# Altium footprint library iuh-thuc-hanh.PcbLib: 63 footprints (part 3 of 4)
Each footprint in its own frame and in the unit in brackets; x right, y up, seen from the top. Pads: shape width x height; smd on the part's side, far side on the other; paste and mask are expansions set on the pad; w line width, h text height; cw(c..) or ccw(c..) is an arc to the next point about the centre after c.
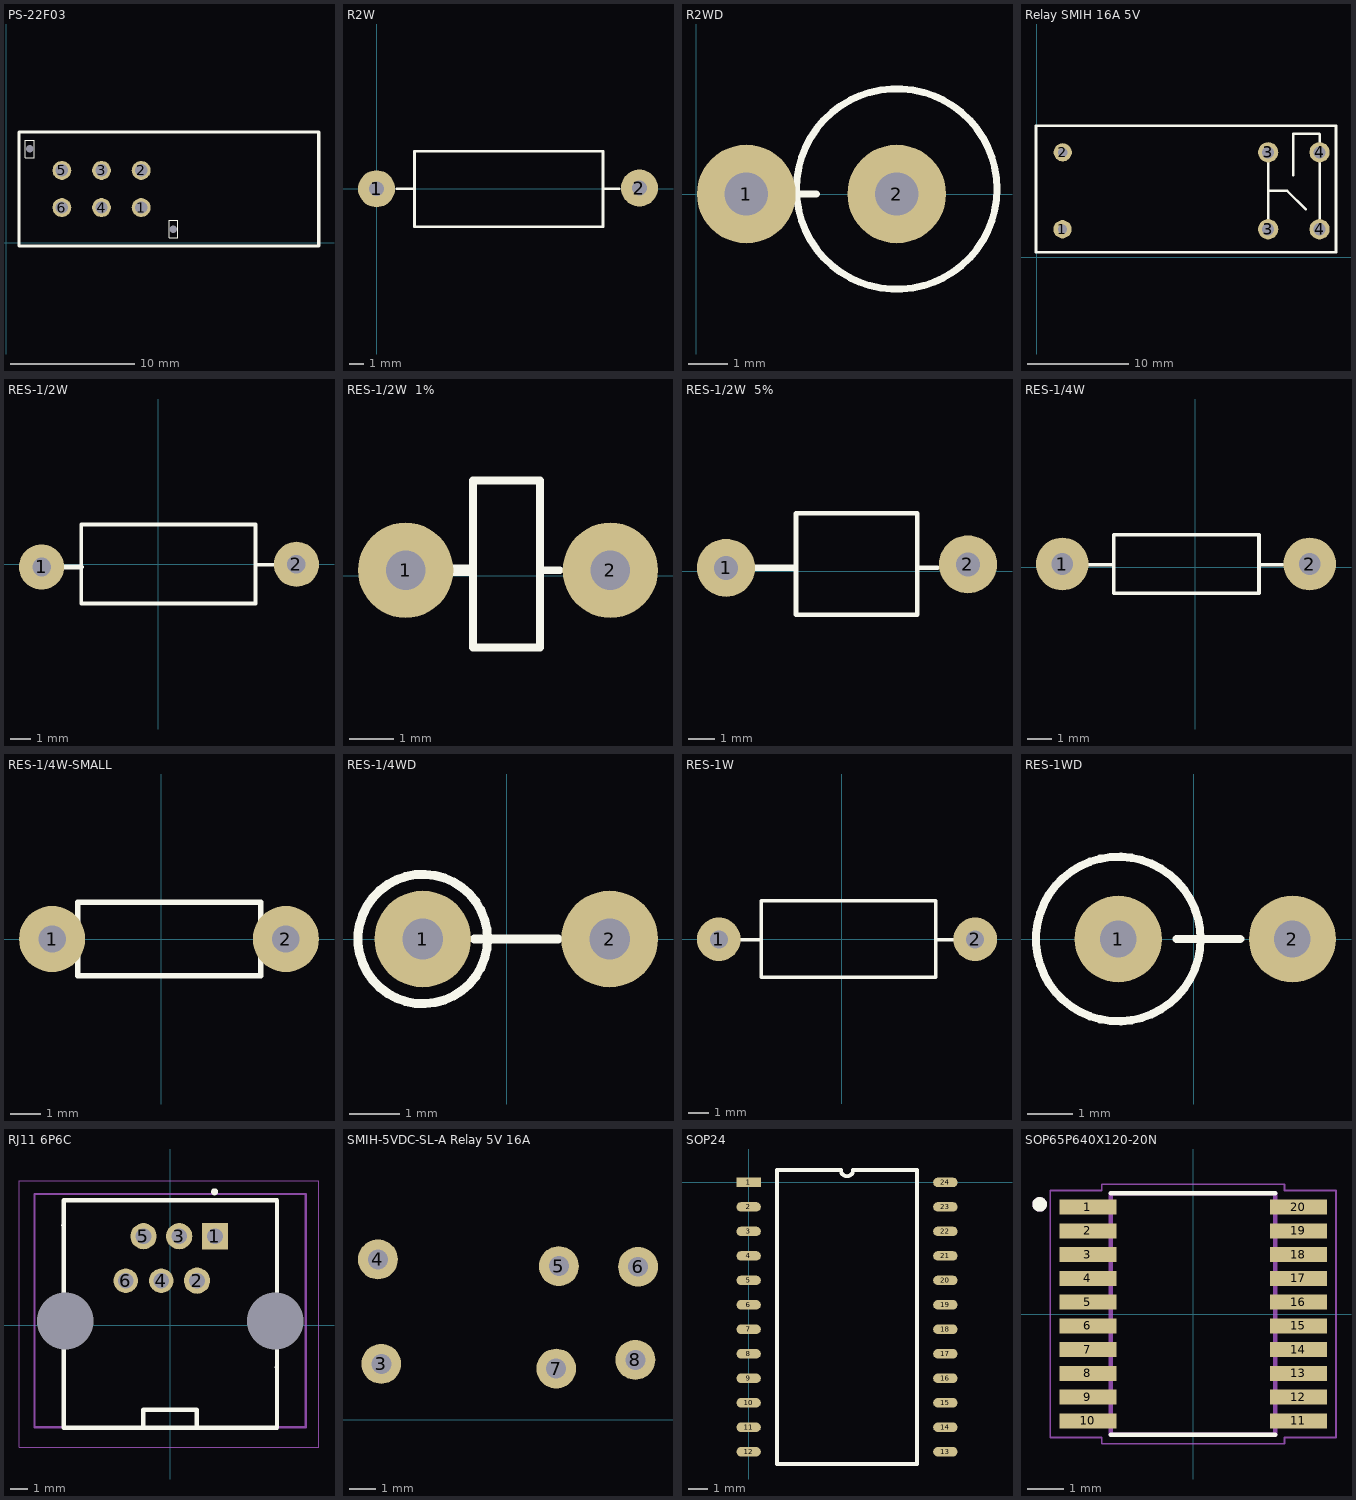
[diagram p2: the footprints below, top view; thin cyan lines are the x and y axes]

## PS-22F03 [mm]
pads (8):
  round 0 hole 0.6 square mask-2539.97: 0(1.88,7.595) 0(13.48,1.095)
  round 1.524 hole 1: 1(10.88,2.845) 2(10.88,5.845) 3(7.68,5.845) 4(7.68,2.845) 5(4.48,5.845) 6(4.48,2.845)
Top Overlay:
  lines w0.1: 1.524,6.883 1.524,8.28 2.235,8.28 2.235,8.077 2.235,6.883 1.524,6.883 ; 13.132,0.406 13.132,1.803 13.843,1.803 13.843,1.6 13.843,0.406 13.132,0.406
  lines w0.254: 25.222,8.941 25.222,-0.254 1.016,-0.254 1.016,8.941 25.246,8.941

## R2W [mm] "R2W, 2 pin, 700mil"
height 5.08
pads (2):
  round 2.5 hole 1: 1(0,0) 2(17.755,0.051)
Top Overlay:
  lines w0.178: 1.372,0 2.565,0 ; 15.316,0 16.383,0 ; 2.565,0 2.565,2.54 15.291,2.54 15.291,-2.565 2.565,-2.565 2.565,0
3D body "SW3dPS-AXIAL_RESISTOR(3W).STEP": height 8.3, standoff -2, extent -2.362,-3.327 19.838,3.273

## R2WD [mm] "R2W, 2 pin, 150mil"
height 5.08
pads (2):
  round 2.5 hole 1.1: 1(1.27,0) 2(5.08,0)
Top Overlay:
  circle w0.178: c5.08,0.127 r2.54
  lines w0.178: 2.159,0 3.048,0
3D body "User Library-User Library-RES-1W_stand_up_6mm.step": height 13.97, standoff -5.5, extent -1.25,-2.413 7.6,2.587

## Relay SMIH 16A 5V [mm]
pads (6):
  round 1.8 hole 0.9: 1(2.54,2.743) 2(2.565,10.343)
  round 2 hole 1.2: 3(22.86,2.743) 3(22.86,10.343) 4(27.94,2.743) 4(27.94,10.343)
Top Overlay:
  lines w0.254: 22.86,2.743 22.86,10.343 ; 22.86,6.543 24.749,6.543 26.594,4.699 ; 25.349,8.077 25.349,12.167 26.035,12.167 27.915,12.167 27.94,12.141 27.94,10.343 27.94,2.743 ; -0.076,0.483 -0.076,12.983 29.566,12.983 29.566,0.457 -0.051,0.457 -0.076,0.483

## RES-1/2W [mil]
height 100
pads (2):
  round 85 hole 35: 1(-220,-5) 2(260,0)
Top Overlay:
  lines w7: 183,-1 221,-1 ; -145,-73.81 -145,75 183,75 183,-73.81 -145,-73.81
  lines w10: -195,-5 -145,-5
3D body "User Library-Metal film resistor0_5W.step": height 121.06, standoff -118.11, extent -230,-60 270,56.14

## RES-1/2W  1% [mil]
height 100
pads (2):
  round 85 hole 35: 1(72.5,5) 2(255.12,5)
Top Overlay:
  lines w7: 192.5,5 210,5 ; 132.5,-63.81 132.5,85 192.5,85 192.5,-63.81 132.5,-63.81
  lines w10: 97.5,5 127.5,5

## RES-1/2W  5% [mil]
height 100
pads (2):
  round 85 hole 35: 1(72.5,5) 2(426.85,10)
Top Overlay:
  lines w7: 353.09,5 365,5 382.5,5 ; 175,-63.81 352.5,-63.81 352.5,85 175,85 175,-63.81
  lines w10: 97.5,5 127.5,5 172.5,5

## RES-1/4W [mil]
height 100
pads (2):
  round 85 hole 35: 1(-215,5) 2(185,5)
Top Overlay:
  lines w5.91: -173,4 -132,4 ; 103,4 141,4 ; -132,-42.24 103,-42.24 103,52.25 -132,52.25 -132,-42.24
3D body "User Library-Res40-Axial Short 0_25W-0_1R.step": height 95, standoff -78.74, extent -226.8,-42.24 196.82,52.25

## RES-1/4W-SMALL [mil]
height 100
pads (2):
  round 85 hole 35: 1(-140,0) 2(160,0)
Top Overlay:
  lines w7: -148,-1 -107,-1 ; 128,-1 166,-1 ; -107,-47.24 -107,47.25 128,47.25 128,-47.24 -107,-47.24
3D body "User Library-R-Axial-0_25W-7_62.step": height 97.4, standoff -146.85, extent -151.8,-47.39 171.82,47.4

## RES-1/4WD [mm]
height 2.54
pads (2):
  round 1.905 hole 0.8: 1(-1.651,0) 2(2.032,0)
Top Overlay:
  circle w0.178: c-1.651,0 r1.276
  lines w0.178: -0.635,0 1.016,0
3D body "User Library-RESAD375W60L650D230_0_25W.STEP": height 9.64, standoff -2.66, extent -2.854,-1.143 2.346,1.157

## RES-1W [mil]
height 100
pads (2):
  round 85 hole 35: 1(-240,0) 2(260,0)
Top Overlay:
  lines w7: -198,-1 -157,-1 ; 183,-1 221,-1 ; -157,-73.81 183,-73.81 183,75 -157,75 -157,-73.81
3D body "User Library-Res50-Axial 0_5W-3_3K.step": height 188.98, standoff -180.12, extent -254.76,-73.81 274.77,73.82

## RES-1WD [mm]
height 2.54
pads (2):
  round 1.905 hole 0.8: 1(-1.651,0) 2(2.159,0)
Top Overlay:
  circle w0.178: c-1.651,0 r1.8
  lines w0.178: -0.381,0 1.016,0
3D body "SW3DPS-0_5W METAL FILM RESISTOR-DEFAULT.STEP": height 12.65, standoff -5.05, extent -3.429,-1.7 2.671,1.7

## RJ11 6P6C [mm]
pads (8):
  rect 1.5x1.5 hole 0.9: 1(2.559,5.08)
  round 1.5 hole 0.9: 2(1.539,2.54) 3(0.519,5.08) 5(-1.521,5.08)
  round 1.4 hole 0.9: 4(-0.501,2.54) 6(-2.541,2.54)
  round 2.3 hole 3.25 unplated: ""(-5.991,0.24) ""(6.009,0.24)
Top Overlay:
  circle w0.2: c2.54,7.62 r0.1
  lines w0.254: -6.096,5.715 -6.091,5.71 ; -1.524,-5.842 -1.524,-4.842 1.524,-4.842 1.524,-5.842 ; 6.096,-2.413 6.109,-2.426 ; -6.091,-5.86 -6.091,7.14 6.109,7.14 6.109,-5.86 -6.091,-5.86
Mechanical 13:
  lines w0.127: -7.747,-5.842 -7.747,7.493 7.747,7.493 7.747,-5.842 -7.747,-5.842
Mechanical 15:
  lines w0.05: -8.636,-6.985 -8.636,8.255 8.509,8.255 8.509,-6.985 -8.636,-6.985
3D body "TJ6P6C gray.stp": height 14.55, standoff -3.2, extent -7.244,-5.695 7.256,7.305

## SMIH-5VDC-SL-A Relay 5V 16A [mil]
pads (6):
  round 60 hole 30: 3(99,84) 4(94,241) 5(366,231) 6(485,230) 7(362,77) 8(481,90)

## SOP24 [mm]
pads (24):
  rect 1.27x0.49 smd: 1(0,0)
  oval 1.27x0.49 smd: 2(0,-1.27) 3(0,-2.54) 4(0,-3.81) 5(0,-5.08) 6(0,-6.35) 7(0,-7.62) 8(0,-8.89) 9(0,-10.16) 10(0,-11.43) 11(0,-12.7) 12(0,-13.97) 13(10.2,-13.97) 14(10.2,-12.7) 15(10.2,-11.43) 16(10.2,-10.16) 17(10.2,-8.89) 18(10.2,-7.62) 19(10.2,-6.35) 20(10.2,-5.08) 21(10.2,-3.81) 22(10.2,-2.54) 23(10.2,-1.27) 24(10.2,0)
Top Overlay:
  lines w0.2: 1.47,-14.605 1.47,0.635 4.782,0.635 ccw(c5.1,0.635) 5.417,0.635 8.73,0.635 8.73,-14.605 1.47,-14.605

## SOP65P640X120-20N [mm]
pads (20):
  rect 1.56x0.41 smd: 1(-2.88,2.925) 2(-2.88,2.275) 3(-2.88,1.625) 4(-2.88,0.975) 5(-2.88,0.325) 6(-2.88,-0.325) 7(-2.88,-0.975) 8(-2.88,-1.625) 9(-2.88,-2.275) 10(-2.88,-2.925) 11(2.88,-2.925) 12(2.88,-2.275) 13(2.88,-1.625) 14(2.88,-0.975) 15(2.88,-0.325) 16(2.88,0.325) 17(2.88,0.975) 18(2.88,1.625) 19(2.88,2.275) 20(2.88,2.925)
Top Overlay:
  circle w0.2: c-4.2,3 r0.1
  lines w0.127: -2.25,-3.3 2.25,-3.3 ; -2.25,3.3 2.25,3.3
Mechanical 13:
  circle w0.2: c-4.2,3 r0.1
  lines w0.127: -2.25,-3.3 -2.25,3.3 2.25,3.3 2.25,-3.3 -2.25,-3.3
Mechanical 15:
  lines w0.05: -3.91,-3.38 -3.91,3.38 -2.5,3.38 -2.5,3.55 2.5,3.55 2.5,3.38 3.91,3.38 3.91,-3.38 2.5,-3.38 2.5,-3.55 -2.5,-3.55 -2.5,-3.38 -3.91,-3.38
3D body "step_temp.STEP": height 0.53, standoff -0.67, extent -3.2,-3.25 3.2,3.25